# Altium schematic symbol library AD_Lib.SchLib: 1239 symbols (part 4 of 9) (continued)
## IC_R4F70580SCK80FPV (continued)
part C text: Power = PVcc1
part D text: Power = PVcc2

## IC_RTC-7301SF
designator IC?, comment RTC-7301SF
RTC,4bit,2.4~5.5V; Manufacturer: Epson ToYoCom; pro-environment: RoHS; Quality: -40~85¡æ; SN: 03.4.11.14.75730101S; OPN: RTC-7301SF:B3; PadsNum: 0; Value: 2.4~5.5V; Category: ¼¯³ÉÐ¾Æ¬; Part: RTC-7301SF; QTY: 250; Price: 37.7325; OPN_JLC: OPN_JLC; SN_JLC: SN_JLC; Price_JLC: 0
footprint RTC-7301SF (RTC£¬·Ç±ê×¼SSOP-24)
pins: 1 ~{CS0} (in), 2 FCON (in), 3 FOUT (out), 4 VTEMP (in), 5 VDD (power), 6 ~{IRQ} (out), 7 A0 (in), 8 A1 (in), 9 A2 (in), 10 A3 (in), 11 ~{RD} (in), 12 GND (power), 13 ~{WR} (in), 14 D3 (io), 15 D2 (io), 16 D1 (io), 17 D0 (io), 18 CS1 (in), 19 VDD (power), 20 VDD (power), 21 VDD (power), 22 VDD (power), 23 VDD (power), 24 VDD (power)

## IC_SCE5743P
designator IC?, comment SCE5743
µãÕóÊýÂë¹Ü£¬4×Ö·û£¬SPI½Ó¿Ú; Manufacturer: ORSAM; pro-environment: RoHS; Quality: -40~85¡æ; SN: 03.4.33.11.11574310S; Value: Green; other: Vcc=5V; OPN: SCE5743P; PadsNum: 0; Category: ¼¯³ÉÐ¾Æ¬; Part: SCE5743; QTY: 20; Price: ?; OPN_JLC: OPN_JLC; SN_JLC: SN_JLC; Price_JLC: 0
footprint SCE5743P (µãÕóÊýÂë¹Ü)
pins: 1 VCC (power) "Anode", 2 LOAD (in) "Anode", 3 DATA (io) "Anode", 4 NC "Anode", 5 ~{SDCLK} (in) "Anode", 6 ~{RST} (in) "Anode", 7 GND (power) "Anode"

## IC_SI4460-C2A-GM
designator IC?, comment SI4460
RFÊÕ·¢Æ÷; 1Mb/s; 142~1050MHz; 13dBm; 1.8~3.6V;; Manufacturer: Silicon Labs; pro-environment: RoHS; Quality: -40~85¡æ; Value: 1Mb/s, 1.8~3.6V;; OPN: SI4460-C2A-GM; other: Tx&Rx; 1Mb/s; 142~1050MHz; 13dBm; 1.8~3.6V;; PadsNum: 0; SN: SN; Category: ¼¯³ÉÐ¾Æ¬; Part: SI4460; QTY: 490; Price: 17.3628; OPN_JLC: OPN_JLC; SN_JLC: SN_JLC; Price_JLC: 0
footprint QFN20_4*4 (20-Pin Plastic Quad Flat No-Lead 0.65 mm Pitch, IPC Low Density)
pins: 0 PAD (power), 1 SDN (in), 2 RxP (in), 3 RxN (in), 4 Tx (out), 7 TXRAMP (out), 8 VDD (power), 9 GPIO0 (io), 10 GPIO1 (io), 11 ~{IRQ} (out), 12 SCLK (in), 13 SDO (out), 14 SDI (in), 15 ~{SEL} (in), 16 XOUT (out), 17 XIN (in), 18 GND (power), 19 GPIO2 (io), 20 GPIO3 (io)
text: ISM; ÊÕ·¢Æ÷

## IC_SI8751AB-IS
designator IC?, comment SI8751
¹âñî; FETÇý¶¯;; Manufacturer: Silicon Labs; pro-environment: RoHS; Quality: -40~105¡æ; Value: 7.9kHz; OPN: SI8751AB-ISR; other: 2.25V~5.5V; PadsNum: 8; SN: SN; Category: ¼¯³ÉÐ¾Æ¬; Part: SI8751; QTY: 96; Price: 9.7971; OPN_JLC: SI8751AB-ISR; SN_JLC: C430294; Price_JLC: 0
footprint SO-8 (SOIC, 8-Leads, Body 4.9x3.9mm, Pitch 1.27mm, IPC Low Density)
pins: 1 VDD (power), 2 TT (in), 3 IN (in), 4 GND (power), 5 SOURCE (out), 6 MCAP2 (power), 7 MCAP1, 8 GATE (out)
text: CAP1; D; S; CAP2

## IC_Si8902B-A01-GS
designator IC?, comment SI8902B
AD; ¸ôÀëÐÍ; 3Í¨µÀ; 10bit; SPI; 2.7~3.6V; Manufacturer: Silicon Labs; Quality: -40~85¡æ; Value: 200 kS/s,10bit; pro-environment: RoHS; other: 200 kS/s;10bit;2.7V~3.6V; 2.5kV; OPN: Si8902B-A01-GS; PadsNum: 16; SN: SN; Category: ¼¯³ÉÐ¾Æ¬; Part: SI8902B; QTY: 50; Price: 23.3797; OPN_JLC: OPN_JLC; SN_JLC: SN_JLC; Price_JLC: -
footprint SO-16_W (¿íÌåSO-16£¬ÈçADuM1410BRWZ)
pins: 1 VDDA (power), 2 ~{RST} (in), 4 VREF (in), 5 AIN0 (in), 6 AIN1 (in), 7 AIN2 (in), 8 GNDA (power), 9 GNDB (power), 10 VDDB (power), 11 ~{CS} (in), 12 SDI (in), 13 SCLK (in), 14 SDO (out), 16 VDDB (power)
text: AD; ×ª»»Æ÷; 10bit, SPI; ¸ôÀëÐÍ

## IC_Si8932B-IS
designator IC?, comment Si8932
¸ôÀëÔË·Å; Vin=0~2.5V; BW=600kHz; 3.0~5.5V; Manufacturer: Silicon Labs; pro-environment: RoHS; Quality: -40~125¡æ; OPN: Si8932B-IS; other: 3V~5.5V;Gain=1 V/V; PadsNum: 8; SN: SN; Value: BW=600kHz; Category: ¼¯³ÉÐ¾Æ¬; Part: Si8932; QTY: 84; Price: 32.3406; OPN_JLC: Si8932B-IS; SN_JLC: SN_JLC; Price_JLC: -
footprint SSO-8 (¸ôÀëÔË·Å£¬ADI)
pins: 1 VDDA (power), 2 Vin (in), 4 GNDA (power), 5 GNDB (power), 6 GNDB (power), 7 AO (out), 8 VDDB
text: 5,6

## IC_SI-60118-F
designator IC?, comment SI-60118-F
ÒÔÌ«Íø¶Ë×Ó; Manufacturer: Bel; pro-environment: RoHS; Quality: -40~85¡æ; SN: 03.4.31.26.99601801S; Value: 10kHz~100MHz; other: 1.5kV,10kHz~100MHz; PadsNum: 0; Category: ¼¯³ÉÐ¾Æ¬; OPN: SI-60118-F; Part: SI-60118-F; QTY: 50; Price: 31.5315; OPN_JLC: OPN_JLC; SN_JLC: SN_JLC; Price_JLC: 0
footprint SI-60118-F
pins: 1 TD+, 2 CT, 3 TD-, 4 RD+, 5 CT, 6 RD-, 8 CHS, 9 LED_LA-G, 10 LED_LK-G, 11 LED_RA-Y, 12 LED_RK-Y, 15 CHS, 16 CHS

## IC_SN65HVD11D
designator IC?, comment SN65HVD11D
RS485ÊÕ·¢Æ÷,°ëË«¹¤,3.0~3.6V; Manufacturer: TI; Quality: -40~85¡æ; Value: RS485,10Mb/s; pro-environment: RoHS; SN: 03.4.11.25.82651101S; PadsNum: 0; other: 3.0~3.6V; Category: ¼¯³ÉÐ¾Æ¬; OPN: SN65HVD11D; Part: SN65HVD11D; QTY: 75; Price: 21.411; OPN_JLC: OPN_JLC; SN_JLC: SN_JLC; Price_JLC: 0
footprint SO-8 (SOIC, 8-Leads, Body 4.9x3.9mm, Pitch 1.27mm, IPC Low Density)
pins: 1 R (out), 2 ~{RE} (in), 3 DE (in), 4 D (in), 5 GND (power), 6 A (io), 7 B (io), 8 VCC (power)

## IC_SN65HVD33D
designator IC?, comment SN65HVD33
RS485ÊÕ·¢Æ÷,È«Ë«¹¤,3~3.6V; Manufacturer: TI; Quality: -40~85¡æ; Value: 26 Mb/s; pro-environment: RoHS; other: 3~3.6V,26 Mb/s,È«Ë«¹¤; OPN: SN65HVD33D; PadsNum: 0; SN: SN; Category: ¼¯³ÉÐ¾Æ¬; Part: SN65HVD33; QTY: 50; Price: 25.2252; OPN_JLC: OPN_JLC; SN_JLC: SN_JLC; Price_JLC: 0
footprint SO-14 (14-Pin Small Outline Integrated Circuit 1.27 mm Pitch, IPC Low Density)
pins: 2 RXD (out), 3 ~{RE} (in), 4 DE (in), 5 TXD (in), 6 GND (power), 7 GND (power), 9 Y (io), 10 Z (io), 11 B (io), 12 A (io), 13 VCC (power), 14 VCC (power)

## IC_SN65HVD230D
designator IC?, comment SN65HVD230
CANÊÕ·¢Æ÷,3.0~3.6V; Manufacturer: TI; Quality: -40~85¡æ; Value: CAN,1MBd; pro-environment: RoHS; SN: 03.4.11.25.84D23001S; OPN: SN65HVD230D; PadsNum: 0; other: 3.0~3.6V; Category: ¼¯³ÉÐ¾Æ¬; Part: SN65HVD230; QTY: 75; Price: 17.3043; OPN_JLC: OPN_JLC; SN_JLC: SN_JLC; Price_JLC: 0
footprint SO-8 (SOIC, 8-Leads, Body 4.9x3.9mm, Pitch 1.27mm, IPC Low Density)
pins: 1 TXD (in), 2 GND (power), 3 VCC (power), 4 RXD (out), 5 Vref (power), 6 CANL (io), 7 CANH (io), 8 Rs (in)

## IC_SN65HVD1050D
designator IC?, comment SN65HVD1050
CANÊÕ·¢Æ÷,4.5~5.5V; Manufacturer: TI; Quality: -40~125¡æ; Value: CAN,1MBd; pro-environment: RoHS; SN: 03.4.11.25.84105002S; OPN: SN65HVD1050D; PadsNum: 0; other: 4.5~5.5V; Category: ¼¯³ÉÐ¾Æ¬; Part: SN65HVD1050; QTY: 75; Price: 8.0379; OPN_JLC: OPN_JLC; SN_JLC: SN_JLC; Price_JLC: 0
footprint SO-8 (SOIC, 8-Leads, Body 4.9x3.9mm, Pitch 1.27mm, IPC Low Density)
pins: 1 TXD (in), 2 GND (power), 3 VCC (power), 4 RXD (out), 5 Vref (power), 6 CANL (io), 7 CANH (io), 8 S (in)

## IC_SN65LBC184
designator IC?, comment SN65LBC184
RS485ÊÕ·¢Æ÷,°ëË«¹¤,4.75~5.25V; Manufacturer: TI; Quality: -40~85¡æ; Value: RS485,0.25Mb/s; pro-environment: RoHS; SN: 03.4.11.25.8465LB01S; OPN: SN65LBC184D; PadsNum: 0; other: 4.75~5.25V; Category: ¼¯³ÉÐ¾Æ¬; Part: SN65LBC184; QTY: 75; Price: 22.9554; OPN_JLC: OPN_JLC; SN_JLC: SN_JLC; Price_JLC: 0
footprint SO-8 (SOIC, 8-Leads, Body 4.9x3.9mm, Pitch 1.27mm, IPC Low Density)
pins: 1 R (out), 2 ~{RE} (in), 3 DE (in), 4 D (in), 5 GND (power), 6 A (io), 7 B (io), 8 VCC (power)

## IC_SN74AHC00PW
designator IC?, comment SN74AHC00
Âß¼­ÃÅ_Óë·ÇÃÅ,4P,2~5.5V; Manufacturer: TI; pro-environment: RoHS; Quality: -40~125¡æ; SN: 03.4.11.18.75HC0001S; Other: 4Í¨µÀ2ÊäÈë»òÓë·ÇÃÅ; Value: NAND,2~5.5V; OPN: SN74AHC00PW; PadsNum: 0; Category: ¼¯³ÉÐ¾Æ¬; Part: SN74AHC00; QTY: 90; Price: 1.404; OPN_JLC: OPN_JLC; SN_JLC: SN_JLC; Price_JLC: 0
footprint SOT353_M (SOT353, 5-Leads, Body 2x1.3mm, Pitch 0.65mm, Lead Span 2.1mm, IPC Low Density)
footprint TSSOP-14 (TSOP, 14-Leads, Body 5x4.4mm, Pitch 0.65mm, IPC Low Density)
part A pins: 1 A (in), 2 B (in), 3 Y (out)
part B pins: 4 A (in), 5 B (in), 6 Y (out)
part C pins: 8 Y (out), 9 A (in), 10 B (in)
part D pins: 11 Y (out), 12 A (in), 13 B (in)
part E pins: 7 GND (power), 14 VCC (power)
part A text: NAND
part B text: NAND
part C text: NAND
part D text: NAND

## IC_SN74AHC1G14DBVT
designator IC?, comment SN74AHC1G14
µ¥·´ÏàÆ÷; Manufacturer: Texas Instruments; pro-environment: RoHS; Quality: -40~80¡æ; SN: 03.4.11.18.491G1401S; OPN: SN74AHC1G14DBVT; Value: 2~5.5V; PadsNum: 0; part: SN74AHC1G14; QTY: 3000; Price: ?; OPN_JLC: OPN_JLC; SN_JLC: SN_JLC; Price_JLC: 0
footprint SOT23-5 (SOT23, 5-Leads, Body 2.9x1.6mm, Pitch 0.95mm, Lead Span 2.7mm, IPC Low Density)
pins: 2 A (in), 3 GND (power), 4 ~{Y} (out), 5 VDD (power)
text: Vcc; Gnd

## IC_SN74AHC1G32DBVR
designator IC?, comment SN74AHC1G32
Âß¼­ÃÅ_»òÃÅ,1P,1.65~5.5V; Manufacturer: TI; pro-environment: RoHS; Quality: -40~85¡æ; SN: 03.4.11.18.491G3202S; Other: µ¥Í¨µÀ2ÊäÈë»òÃÅ; Value: OR,1.65~5.5V; OPN: SN74AHC1G32DBVR; PadsNum: 0; Category: ¼¯³ÉÐ¾Æ¬; Part: SN74AHC1G32; QTY: 3000; Price: 0.71604; OPN_JLC: OPN_JLC; SN_JLC: SN_JLC; Price_JLC: 0
footprint SOT353_M (SOT353, 5-Leads, Body 2x1.3mm, Pitch 0.65mm, Lead Span 2.1mm, IPC Low Density)
footprint SOT23-5 (SOT23, 5-Leads, Body 2.9x1.6mm, Pitch 0.95mm, Lead Span 2.7mm, IPC Low Density)
pins: 1 A (in), 2 B (in), 3 GND (power), 4 Y (out), 5 VDD (power)
text: Vcc; OR; Gnd

## IC_SN74AHC14PW
designator IC?, comment SN74AHC14  (value not drawn)
Âß¼­ÃÅ_·ÇÃÅ,6P,2.0~5.5V; Manufacturer: TI; pro-environment: RoHS; Quality: -55~150¡æ; SN: 03.4.11.18.75AH1401; Value: NOT,2.0~5.5V; OPN: SN74AHC14PW; PadsNum: 0; Category: ¼¯³ÉÐ¾Æ¬; Part: SN74AHC14; QTY: 90; Price: 1.2987; OPN_JLC: OPN_JLC; SN_JLC: SN_JLC; Price_JLC: 0
footprint TSSOP-14 (Shrink Small Outline; 14 Leads; Body Width 4.4 mm; Pitch 0.65 mm)
part A pins: 1 A (in), 2 ~{Y} (out)
part B pins: 3 A (in), 4 ~{Y} (out)
part C pins: 5 A (in), 6 ~{Y} (out)
part D pins: 8 ~{Y} (out), 9 A (in)
part E pins: 10 ~{Y} (out), 11 A (in)
part F pins: 12 ~{Y} (out), 13 A (in)
part G pins: 7 GND (power), 14 VCC (power)

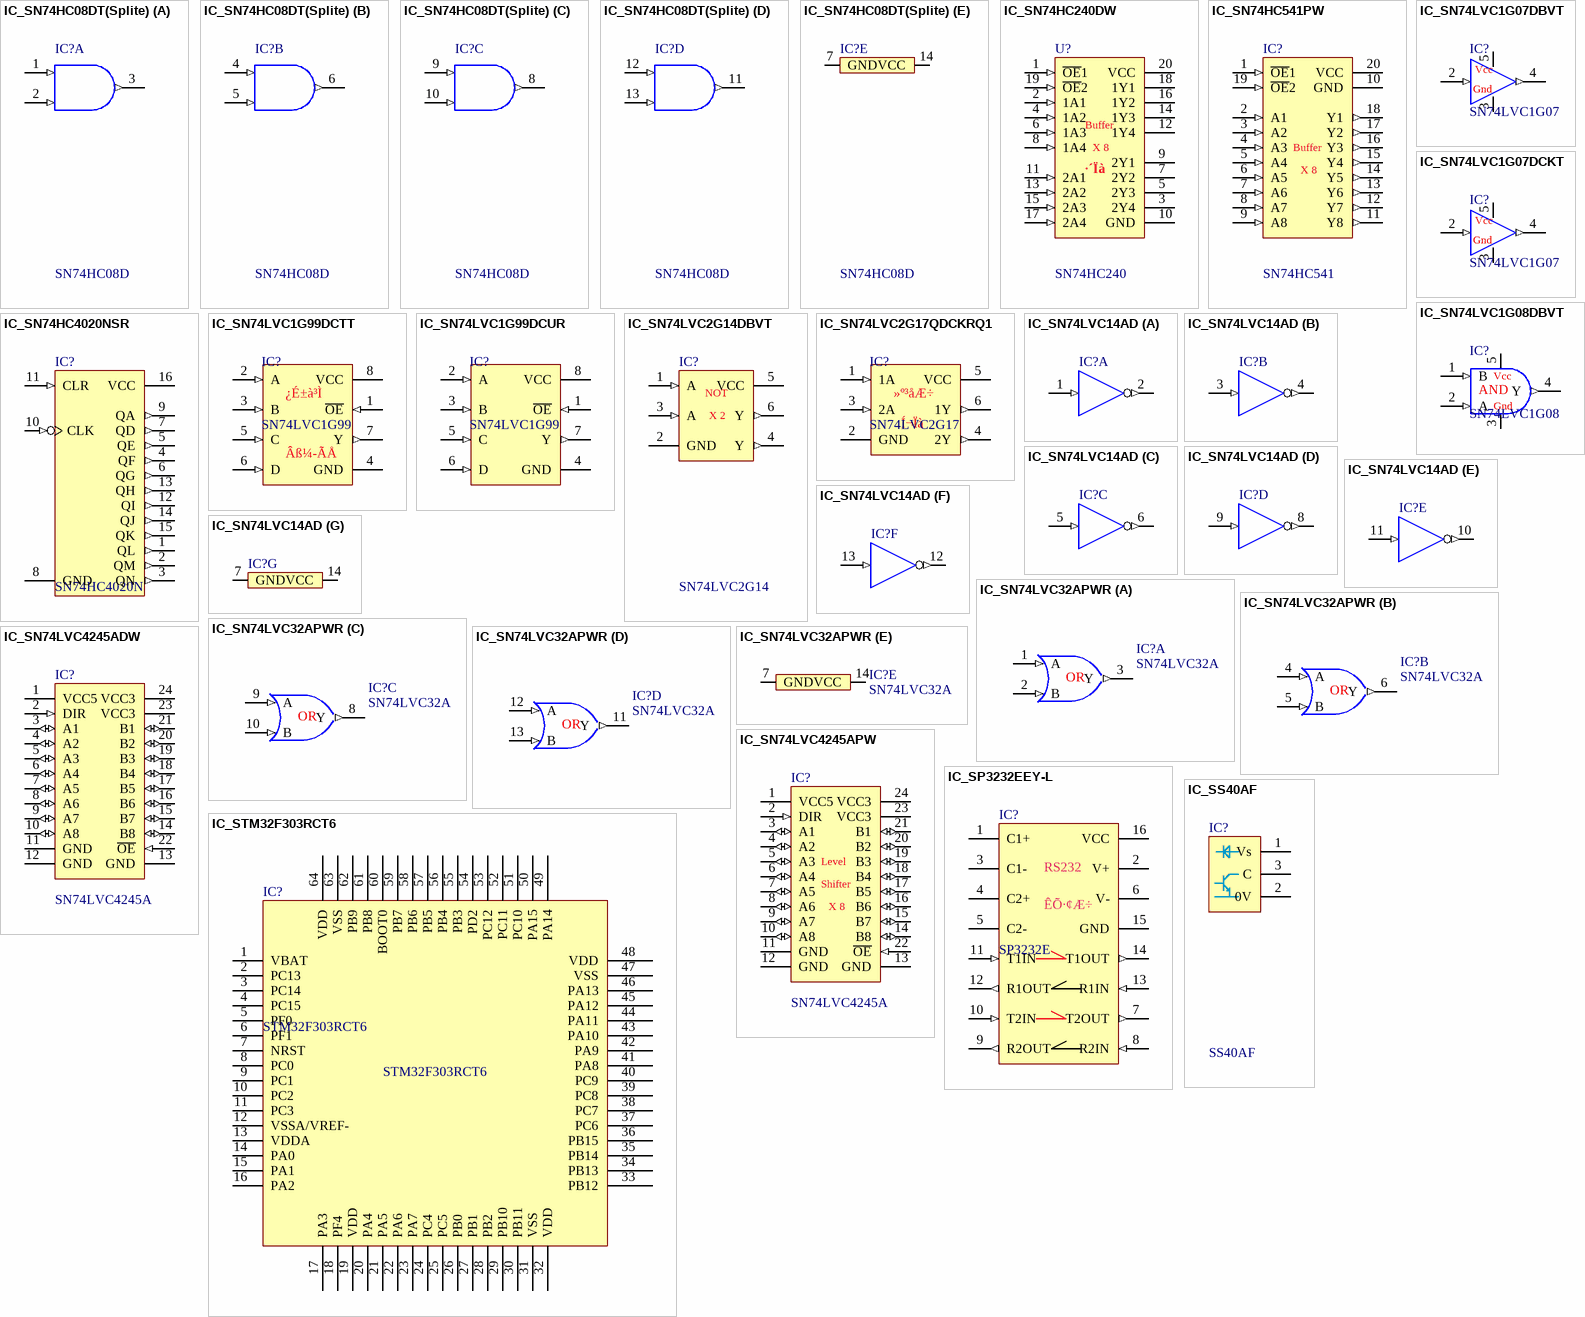
[diagram p18: symbols IC_SN74HC08DT(Splite) to IC_STM32F303RCT6]

## IC_SN74HC08DT(Splite)
designator IC?, comment SN74HC08D
Âß¼­ÃÅ_ÓëÃÅ,4P,2.0~6V; Manufacturer: TI; pro-environment: RoHS; Quality: -40~85¡æ; SN: 03.4.11.18.82HC0801S; OPN: SN74HC08DT; Value: AND,2.0~6V; PadsNum: 0; Category: ¼¯³ÉÐ¾Æ¬; Part: SN74HC08D; QTY: 250; Price: 3.3579; OPN_JLC: OPN_JLC; SN_JLC: SN_JLC; Price_JLC: 0
footprint SO-14 (14-Pin Small Outline Integrated Circuit 1.27 mm Pitch, IPC Low Density)
part A pins: 1 A (in), 2 B (in), 3 Y (out)
part B pins: 4 A (in), 5 B (in), 6 Y (out)
part C pins: 8 Y (out), 9 A (in), 10 B (in)
part D pins: 11 Y (out), 12 A (in), 13 B (in)
part E pins: 7 GND (power), 14 VCC (power)

## IC_SN74HC240DW
designator U?, comment SN74HC240
»º³åÆ÷;8bit;·´Ïà; Manufacturer: TI; pro-environment: RoHS; Quality: -40~85¡æ; Value: Buffer,2~6V; OPN: SN74HC240DW; PadsNum: 0; SN: SN; Category: ¼¯³ÉÐ¾Æ¬; Part: SN74HC240; QTY: 25; Price: 4.0014; OPN_JLC: OPN_JLC; SN_JLC: SN_JLC; Price_JLC: 0
footprint SO-20 (SOIC, 20-Leads, Body 12.8x7.5mm, Pitch 1.27mm, IPC Low Density)
pins: 1 ~{OE}1 (in), 2 1A1 (in), 3 2Y4 (hiz), 4 1A2 (in), 5 2Y3 (hiz), 6 1A3 (in), 7 2Y2 (hiz), 8 1A4 (in), 9 2Y1 (hiz), 10 GND (power), 11 2A1 (in), 12 1Y4 (hiz), 13 2A2 (in), 14 1Y3 (hiz), 15 2A3 (in), 16 1Y2 (hiz), 17 2A4 (in), 18 1Y1 (hiz), 19 ~{OE}2 (in), 20 VCC (power)
text: Buffer; X 8; ·´Ïà

## IC_SN74HC541PW
designator IC?, comment SN74HC541
»º³åÆ÷;8bit; Manufacturer: TI; pro-environment: RoHS; Quality: -40~85¡æ; SN: 03.4.11.19.75H54101S; Value: Buffer; other: Vcc=2~6V; OPN: SN74HC541PW; PadsNum: 0; Category: ¼¯³ÉÐ¾Æ¬; Part: SN74HC541; Price: ?; OPN_JLC: OPN_JLC; SN_JLC: SN_JLC; Price_JLC: 0
footprint TSSOP-20 (Shrink Small Outline; 20 Leads; Body Width 4.4 mm; Pitch 0.65 mm)
pins: 1 ~{OE}1 (in), 2 A1 (in), 3 A2 (in), 4 A3 (in), 5 A4 (in), 6 A5 (in), 7 A6 (in), 8 A7 (in), 9 A8 (in), 10 GND (power), 11 Y8 (out), 12 Y7 (out), 13 Y6 (out), 14 Y5 (out), 15 Y4 (out), 16 Y3 (out), 17 Y2 (out), 18 Y1 (out), 19 ~{OE}2 (in), 20 VCC (power)
text: X 8

## IC_SN74HC4020NSR
designator IC?, comment SN74HC4020N
¼ÆÊýÆ÷;14bit;3.3/5V; Manufacturer: TI; pro-environment: RoHS; Quality: -40~85¡æ; Value: 14bit,2~6V; OPN: SN74HC4020NSR; PadsNum: 0; SN: SN; Category: ¼¯³ÉÐ¾Æ¬; Part: SN74HC4020N; QTY: 2000; Price: 1.7433; OPN_JLC: OPN_JLC; SN_JLC: SN_JLC; Price_JLC: 0
footprint SO-16 (16-Pin Small Outline Package 1.27 mm Pitch, IPC Low Density)
pins: 1 QL (out), 2 QM (out), 3 QN (out), 4 QF (out), 5 QE (out), 6 QG (out), 7 QD (out), 8 GND (power), 9 QA (out), 10 CLK (in), 11 CLR (in), 12 QI (out), 13 QH (out), 14 QJ (out), 15 QK (out), 16 VCC (power)

## IC_SN74LVC1G07DBVT
designator IC?, comment SN74LVC1G07
µ¥»º³åÆ÷;3.3V/5V; Manufacturer: Texas Instruments; pro-environment: RoHS; Quality: -40~125¡æ; OPN: SN74LVC1G07DBVT; Value: 1.65~5.5V; PadsNum: 0; SN: SN; part: SN74LVC1G07; QTY: 250; Price: 3.3345; OPN_JLC: OPN_JLC; SN_JLC: SN_JLC; Price_JLC: 0
footprint SOT23-5 (SOT23, 5-Leads, Body 2.9x1.6mm, Pitch 0.95mm, Lead Span 2.7mm, IPC Low Density)
pins: 2 A (in), 3 GND (power), 4 ~{Y} (out), 5 VDD (power)
text: Vcc; Gnd

## IC_SN74LVC1G07DCKT
designator IC?, comment SN74LVC1G07
µ¥»º³åÆ÷;3.3V/5V; Manufacturer: Texas Instruments; pro-environment: RoHS; Quality: -40~80¡æ; SN: 03.4.11.18.381G0701S; OPN: SN74LVC1G07DCKT; Value: 1.65~5.5V; PadsNum: 0; part: SN74LVC1G07; QTY: 250; Price: 3.3345; OPN_JLC: OPN_JLC; SN_JLC: SN_JLC; Price_JLC: 0
footprint SOT353-5 (SC-70, 5-Leads, Body 2x1.3mm, Pitch 0.65mm, Lead Span 2.1mm, IPC Low Density)
pins: 2 A (in), 3 GND (power), 4 ~{Y} (out), 5 VDD (power)
text: Vcc; Gnd

## IC_SN74LVC1G08DBVT
designator IC?, comment SN74LVC1G08
Âß¼­ÃÅ_ÓëÃÅ,1P,1.65~5.5V; Manufacturer: TI; pro-environment: RoHS; Quality: -40~85¡æ; SN: 03.4.11.18.491G0801S; Other: µ¥Í¨µÀ2ÊäÈëÓëÃÅ; Value: AND,1.65~5.5V; OPN: SN74LVC1G08DBVT; PadsNum: 0; Category: ¼¯³ÉÐ¾Æ¬; Part: SN74LVC1G08; Price: ?; OPN_JLC: OPN_JLC; SN_JLC: SN_JLC; Price_JLC: 0
footprint SOT353_M (SOT353, 5-Leads, Body 2x1.3mm, Pitch 0.65mm, Lead Span 2.1mm, IPC Low Density)
footprint SOT23-5 (SOT23, 5-Leads, Body 2.9x1.6mm, Pitch 0.95mm, Lead Span 2.7mm, IPC Low Density)
pins: 1 B (in), 2 A (in), 3 GND (power), 4 Y (out), 5 VDD (power)
text: Vcc; AND; Gnd

## IC_SN74LVC1G99DCTT
designator IC?, comment SN74LVC1G99
¿É±à³ÌÂß¼­ÃÅ;2In;Ê©ÃÜÌØÊäÈë; Manufacturer: TI; pro-environment: RoHS; Quality: -40~125¡æ; OPN: SN74LVC1G99DCTT; Value: 1.8~5V; PadsNum: 0; SN: SN; part: SN74LVC1G99; QTY: 3000; Price: 1.3447; Category: ¼¯³ÉÐ¾Æ¬; OPN_JLC: OPN_JLC; SN_JLC: SN_JLC; Price_JLC: 0
footprint MSOP-8 (Shrink Small Outline; 8 Leads; Body Width 3 mm; Pitch 0.65 mm)
pins: 1 ~{OE} (in), 2 A (in), 3 B (in), 4 GND (power), 5 C (in), 6 D (in), 7 Y (out), 8 VCC
text: ¿É±à³Ì; Âß¼­ÃÅ

## IC_SN74LVC1G99DCUR
designator IC?, comment SN74LVC1G99
¿É±à³ÌÂß¼­ÃÅ;2In;Ê©ÃÜÌØÊäÈë; Manufacturer: TI; pro-environment: RoHS; Quality: -40~125¡æ; OPN: SN74LVC1G99DCUR; Value: 1.8~5V; PadsNum: 0; SN: SN; part: SN74LVC1G99; QTY: 3000; Price: 1.3447; Category: ¼¯³ÉÐ¾Æ¬; OPN_JLC: OPN_JLC; SN_JLC: SN_JLC; Price_JLC: 0
footprint VSSOP-8 (Footprint not found)
pins: 1 ~{OE} (in), 2 A (in), 3 B (in), 4 GND (power), 5 C (in), 6 D (in), 7 Y (out), 8 VCC

## IC_SN74LVC2G14DBVT
designator IC?, comment SN74LVC2G14
Âß¼­ÃÅ_·ÇÃÅ;2P;1.65~5.5V; Manufacturer: TI; pro-environment: RoHS; Quality: -40~125¡æ; SN: 03.4.11.18.502G1401S; Value: NOT,1.65~5.5V; OPN: SN74LVC2G14DBVT; PadsNum: 0; Category: ¼¯³ÉÐ¾Æ¬; Part: SN74LVC2G14; QTY: 250; Price: 4.8438; OPN_JLC: OPN_JLC; SN_JLC: SN_JLC; Price_JLC: 0
footprint SOT23-6 (SOT23, 6-Leads, Body 2.9x1.6mm, Pitch 0.95mm, Lead Span 2.7mm, IPC Low Density)
pins: 1 A (in), 2 GND (power), 3 A (in), 4 Y (out), 5 VCC (power), 6 Y (out)
text: NOT; X 2

## IC_SN74LVC2G17QDCKRQ1
designator IC?, comment SN74LVC2G17
»º³åÆ÷;2bit;Ê©ÃÜÌØÊäÈë; Manufacturer: Texas Instruments; pro-environment: RoHS; Quality: -40~80¡æ; SN: 03.4.11.19.382G1701S; OPN: SN74LVC2G17QDCKRQ1; Value: 2~5.5V; PadsNum: 0; part: SN74LVC2G17; QTY: 3000; Price: 1.5444; Category: ¼¯³ÉÐ¾Æ¬; OPN_JLC: OPN_JLC; SN_JLC: SN_JLC; Price_JLC: 0
footprint SOT363-6 (SC70-LT6, 6-Leads, Body 2x1.3mm, Pitch 0.65mm, Lead Span 2.1mm, IPC Low Density)
pins: 1 1A (in), 2 GND (power), 3 2A (in), 4 2Y (out), 5 VCC, 6 1Y (out)
text: »º³åÆ÷; Í¬Ïà

## IC_SN74LVC14AD
designator IC?, comment SN74LVC14  (value not drawn)
Âß¼­ÃÅ_·ÇÃÅ,6P,2.0~5.5V; Manufacturer: TI; pro-environment: RoHS; Quality: -40~125¡æ; Value: NOT,2.0~3.6V; OPN: SN74LVC14AD; PadsNum: 0; SN: SN; Category: ¼¯³ÉÐ¾Æ¬; Part: SN74LVC14; QTY: 50; Price: 3.1005; OPN_JLC: OPN_JLC; SN_JLC: SN_JLC; Price_JLC: 0
footprint SO-14 (SOIC, 14-Leads, Body 8.7x3.9mm, Pitch 1.27mm, IPC Low Density)
part A pins: 1 A (in), 2 ~{Y} (out)
part B pins: 3 A (in), 4 ~{Y} (out)
part C pins: 5 A (in), 6 ~{Y} (out)
part D pins: 8 ~{Y} (out), 9 A (in)
part E pins: 10 ~{Y} (out), 11 A (in)
part F pins: 12 ~{Y} (out), 13 A (in)
part G pins: 7 GND (power), 14 VCC (power)

## IC_SN74LVC32APWR
designator IC?, comment SN74LVC32A
Âß¼­ÃÅ_»òÃÅ,4P,1.65~3.6V; Manufacturer: TI; pro-environment: RoHS; Quality: -40~85¡æ; Other: 4Í¨µÀ2ÊäÈë»òÃÅ; Value: OR,1.65~3.6V; OPN: SN74LVC32APWR; PadsNum: 14; SN: SN; Category: ¼¯³ÉÐ¾Æ¬; Part: SN74LVC32A; QTY: 2000; Price: ?; OPN_JLC: SN74LVC32APWR; SN_JLC: C352974; Price_JLC: 0.7637
footprint SOT353_M (SOT353, 5-Leads, Body 2x1.3mm, Pitch 0.65mm, Lead Span 2.1mm, IPC Low Density)
footprint TSSOP-14 (TSOP, 14-Leads, Body 5x4.4mm, Pitch 0.65mm, IPC Low Density)
part A pins: 1 A (in), 2 B (in), 3 Y (out)
part B pins: 4 A (in), 5 B (in), 6 Y (out)
part C pins: 8 Y (out), 9 A (in), 10 B (in)
part D pins: 11 Y (out), 12 A (in), 13 B (in)
part E pins: 7 GND (power), 14 VCC (power)
part A text: OR
part B text: OR
part C text: OR
part D text: OR

## IC_SN74LVC4245ADW
designator IC?, comment SN74LVC4245A
µçÆ½×ª»»£¬8CH; Manufacturer: TI; pro-environment: RoHS; Quality: -40~85¡æ; SN: 03.4.11.18.75424503S; Value: Level shifter,3.3V-5V; other: 3.3V,5.5V; OPN: SN74LVC4245ADW; PadsNum: 0; Category: ¼¯³ÉÐ¾Æ¬; Part: SN74LVC4245A; QTY: 25; Price: ?; OPN_JLC: OPN_JLC; SN_JLC: SN_JLC; Price_JLC: 0
footprint SO-24 (SOIC, 24-Leads, Body 15.4x7.5mm, Pitch 1.27mm,)
pins: 1 VCC5 (power), 2 DIR (in), 3 A1 (io), 4 A2 (io), 5 A3 (io), 6 A4 (io), 7 A5 (io), 8 A6 (io), 9 A7 (io), 10 A8 (io), 11 GND (power), 12 GND (power), 13 GND (power), 14 B8 (io), 15 B7 (io), 16 B6 (io), 17 B5 (io), 18 B4 (io), 19 B3 (io), 20 B2 (io), 21 B1 (io), 22 ~{OE} (in), 23 VCC3 (power), 24 VCC3 (power)

## IC_SN74LVC4245APW
designator IC?, comment SN74LVC4245A
µçÆ½×ª»»£¬8CH; Manufacturer: TI; pro-environment: RoHS; Quality: -40~85¡æ; SN: 03.4.11.19.75424501S; Value: Level shifter,3.3V-5V; other: 3.3V,5.5V; OPN: SN74LVC4245APW; PadsNum: 0; Category: ¼¯³ÉÐ¾Æ¬; Part: SN74LVC4245A; QTY: 60; Price: ?; OPN_JLC: OPN_JLC; SN_JLC: SN_JLC; Price_JLC: 0
footprint TSSOP-24 (Shrink Small Outline; 24 Leads; Body Width 4.4 mm; Pitch 0.65 mm)
pins: 1 VCC5 (power), 2 DIR (in), 3 A1 (io), 4 A2 (io), 5 A3 (io), 6 A4 (io), 7 A5 (io), 8 A6 (io), 9 A7 (io), 10 A8 (io), 11 GND (power), 12 GND (power), 13 GND (power), 14 B8 (io), 15 B7 (io), 16 B6 (io), 17 B5 (io), 18 B4 (io), 19 B3 (io), 20 B2 (io), 21 B1 (io), 22 ~{OE} (in), 23 VCC3 (power), 24 VCC3 (power)
text: Level; Shifter; X 8

## IC_SP3232EEY-L
designator IC?, comment SP3232E
RS232ÊÕ·¢Æ÷£¬2CH; Manufacturer: Exar; Quality: -40~85¡æ; Value: 250kbit/s,3~5.5V; pro-environment: RoHS; SN: 03.4.11.25.75323201S; OPN: SP3232EEY-L; PadsNum: 0; Category: ¼¯³ÉÐ¾Æ¬; Part: SP3232E; QTY: 49; Price: 9.0909; OPN_JLC: OPN_JLC; SN_JLC: SN_JLC; Price_JLC: 0
footprint TSSOP-16 (TSOP, 16-Leads, Body 5x4.4mm, Pitch 0.65mm, IPC Low Density)
pins: 1 C1+, 2 V+, 3 C1-, 4 C2+, 5 C2-, 6 V-, 7 T2OUT (out), 8 R2IN (in), 9 R2OUT (out), 10 T2IN (in), 11 T1IN (in), 12 R1OUT (out), 13 R1IN (in), 14 T1OUT (out), 15 GND (power), 16 VCC (power)
text: RS232; ÊÕ·¢Æ÷

## IC_SS40AF
designator IC?, comment SS40AF
´«¸ÐÆ÷; 4.5~24V; NPN; Î»ÖÃ; Manufacturer: Honeywell; pro-environment: RoHS; Quality: -40~85¡æ; Value: 4.5~24V, NPN; PadsNum: 3; SN: SN; Category: ¼¯³ÉÐ¾Æ¬; OPN: SS40AF; Part: SS40AF; QTY: 3000; other: 4.5~24V; Price: ?; OPN_JLC: SS40AF; SN_JLC: C778657; Price_JLC: 1.0295
footprint U_SS40A (Ö±½Å;TO, Flat Index; 3 In-Line, Axial Leads; Body Dia. 4.7mm; Leads 0.56 x 0.51 mm (max))
pins: 1 Vs (power), 2 0V (power), 3 C (oc)

## IC_STM32F303RCT6
designator IC?, comment STM32F303RCT6
MCU; 32bit; 72MHz; 256kB Flash; 48kB SRAM; Manufacturer: ST; Value: 32bit;72MHz;1.7V~3.6V; pro-environment: RoHS; PadsNum: 0; SN: SN; Category: Microcontrollers -MCU; OPN: STM32F303RCT6; OPN_JLC: STM32F303RCT6; Part: STM32F303RCT6
footprint LQFP-64 (Thin QFP, 64-Leads, Body 10x10mm, Pitch 0.5mm, IPC Low Density)
pins: 1 VBAT, 2 PC13, 3 PC14, 4 PC15, 5 PF0, 6 PF1, 7 NRST, 8 PC0, 9 PC1, 10 PC2, 11 PC3, 12 VSSA/VREF-, 13 VDDA, 14 PA0, 15 PA1, 16 PA2, 17 PA3, 18 PF4, 19 VDD, 20 PA4, 21 PA5, 22 PA6, 23 PA7, 24 PC4, 25 PC5, 26 PB0, 27 PB1, 28 PB2, 29 PB10, 30 PB11, 31 VSS, 32 VDD, 33 PB12, 34 PB13, 35 PB14, 36 PB15, 37 PC6, 38 PC7, 39 PC8, 40 PC9, 41 PA8, 42 PA9, 43 PA10, 44 PA11, 45 PA12, 46 PA13, 47 VSS, 48 VDD, 49 PA14, 50 PA15, 51 PC10, 52 PC11, 53 PC12, 54 PD2, 55 PB3, 56 PB4, 57 PB5, 58 PB6, 59 PB7, 60 BOOT0, 61 PB8, 62 PB9, 63 VSS, 64 VDD

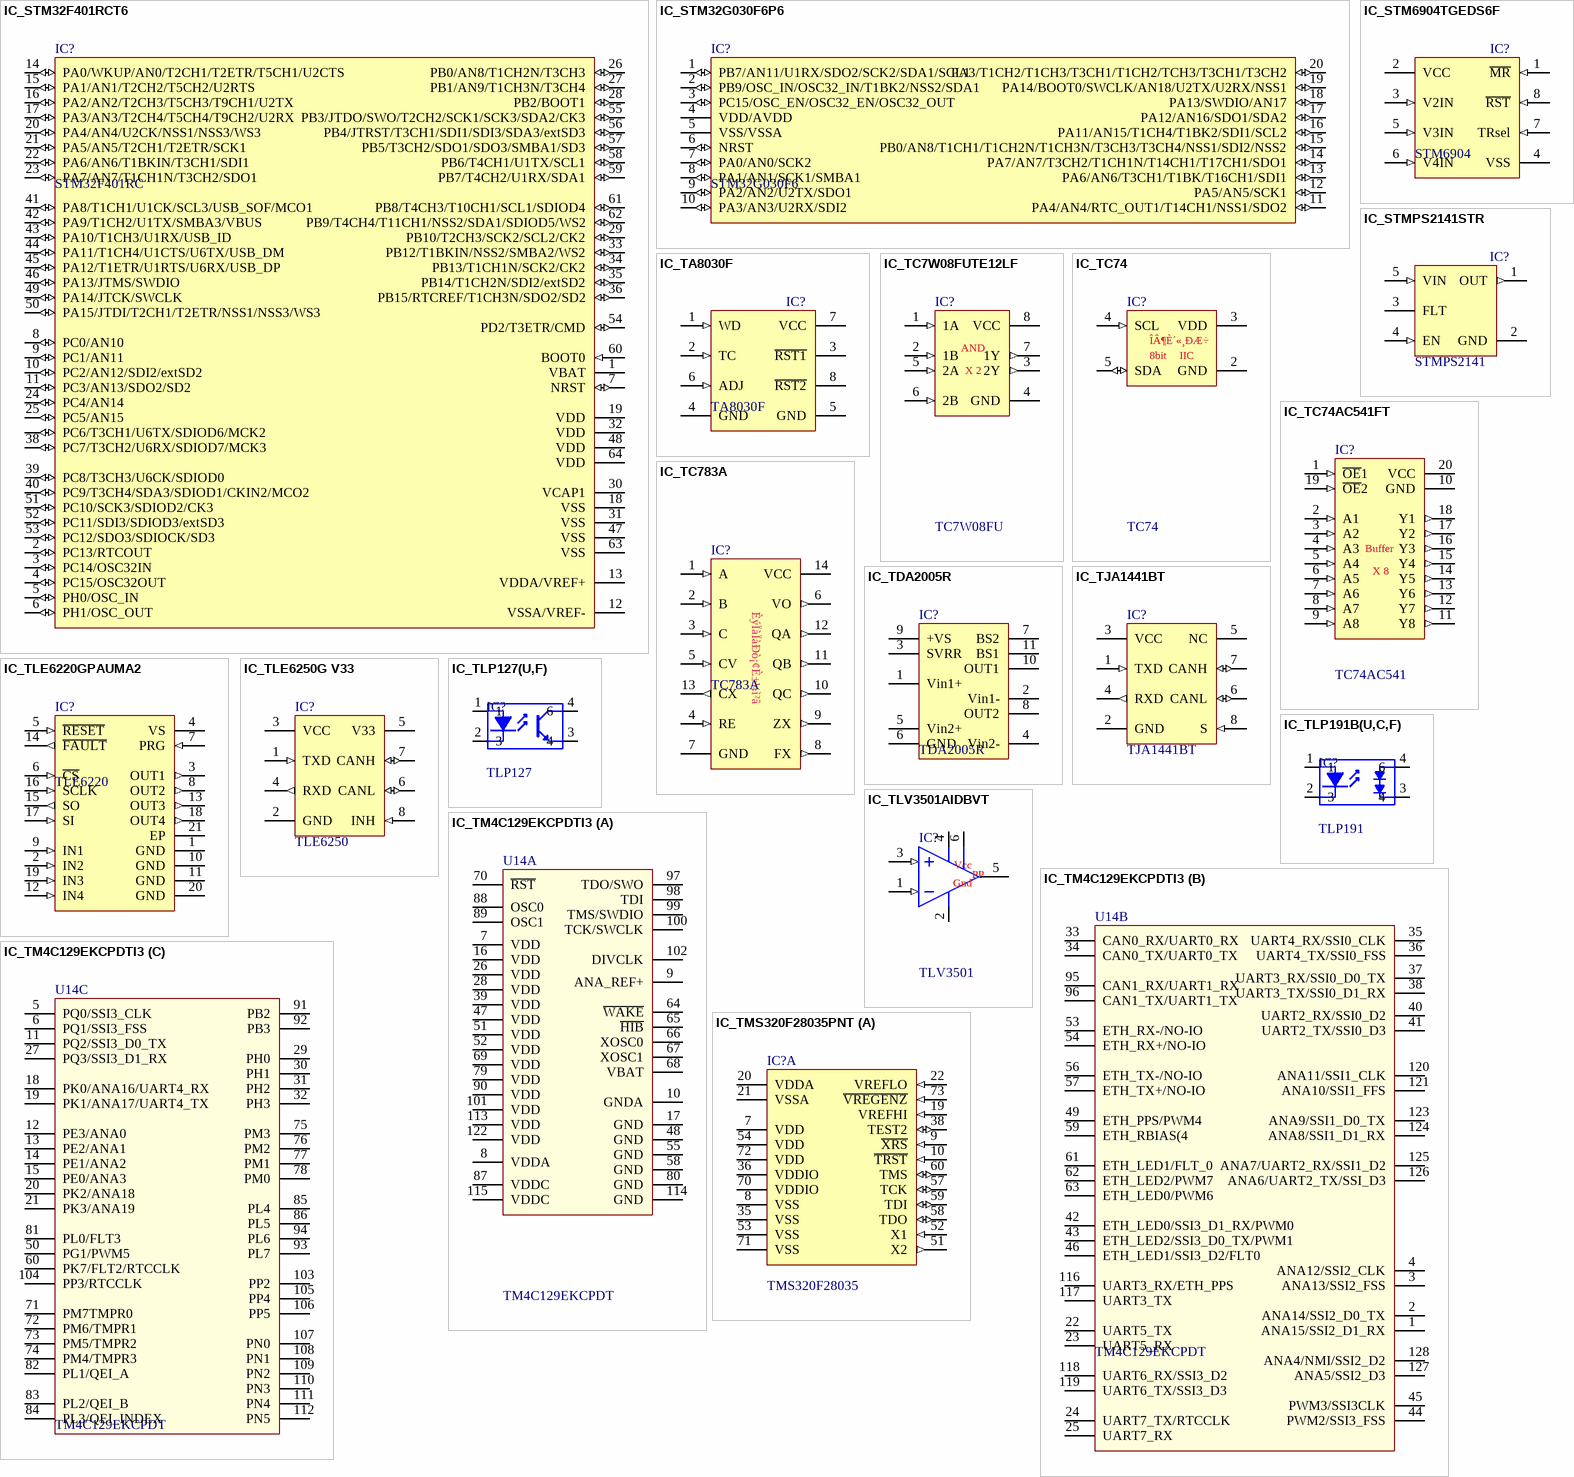
[diagram p19: symbols IC_STM32F401RCT6 to IC_TMS320F28035PNT]

## IC_STM32F401RCT6
designator IC?, comment STM32F401RC
MCU; 32bit; 84MHz; 256kB; 64kB; Manufacturer: ST; Quality: -40~85¡æ; Value: 32bit;84MHz;1.7V~3.6V; pro-environment: RoHS; OPN: STM32F401RCT6; PadsNum: 0; SN: SN; Category: ¼¯³ÉÐ¾Æ¬; Part: STM32F401RC; QTY: 960; Price: 26.0126; OPN_JLC: STM32F401RCT6; SN_JLC: C74524; Price_JLC: 13.93
footprint TQFP-64 (Thin QFP, 64-Leads, Body 10x10mm, Pitch 0.5mm, IPC Low Density)
pins: 1 VBAT (power), 2 PC13/RTCOUT (io) "PC13-ANTI_TAMP/TAMP_1", 3 PC14/OSC32IN (io) "PC14-OSC32_IN/OSC32_IN", 4 PC15/OSC32OUT (io) "PC15-OSC32_OUT/OSC32_OUT", 5 PH0/OSC_IN (io) "PH0-OSC_IN/OSC_IN", 6 PH1/OSC_OUT (io) "PH1-OSC_OUT/OSC_OUT", 7 NRST (io), 8 PC0/AN10 (io) "PC0/ADC1_10", 9 PC1/AN11 (io) "PC1/ADC1_11", 10 PC2/AN12/SDI2/extSD2 (io) "PC2/SPI2_MISO,I2S2ext_SD/ADC1_12", 11 PC3/AN13/SDO2/SD2 (io) "PC3/SPI2_MOSI/I2S2_SD/ADC1_13", 12 VSSA/VREF- (power), 13 VDDA/VREF+ (power), 14 PA0/WKUP/AN0/T2CH1/T2ETR/T5CH1/U2CTS (io) "PA0-WKUP/USART2_CTS,TIM2_CH1/TIM2_ETR,TIM5_CH1/ADC1_0,WKUP", 15 PA1/AN1/T2CH2/T5CH2/U2RTS (io) "PA1/USART2_RTS,TIM2_CH2,TIM5_CH2/ADC1_1", 16 PA2/AN2/T2CH3/T5CH3/T9CH1/U2TX (io) "PA2/USART2_TX,TIM2_CH3,TIM5_CH3,TIM9_CH1/ADC1_2", 17 PA3/AN3/T2CH4/T5CH4/T9CH2/U2RX (io) "PA3/USART2_RX,TIM2_CH4,TIM5_CH4,TIM9_CH2/ADC1_3", 18 VSS (power), 19 VDD (power), 20 PA4/AN4/U2CK/NSS1/NSS3/WS3 (io) "PA4/SPI1_NSS,SPI3_NSS/I2S3_WS,USART2_CK/ADC1_4", 21 PA5/AN5/T2CH1/T2ETR/SCK1 (io) "PA5/SPI1_SCK,TIM2_CH1/TIM2_ETR/ADC1_5", 22 PA6/AN6/T1BKIN/T3CH1/SDI1 (io) "PA6/SPI1_MISO,TIM1_BKIN,TIM3_CH1/ADC1_6", 23 PA7/AN7/T1CH1N/T3CH2/SDO1 (io) "PA7/SPI1_MOSI,TIM1_CH1N,TIM3_CH2/ADC1_7", 24 PC4/AN14 (io) "PC4/ADC1_14", 25 PC5/AN15 (io) "PC5/ADC1_15", 26 PB0/AN8/T1CH2N/T3CH3 (io) "PB0/TIM1_CH2N,TIM3_CH3/ADC1_8", 27 PB1/AN9/T1CH3N/T3CH4 (io) "PB1/TIM1_CH3N,TIM3_CH4/ADC1_9", 28 PB2/BOOT1 (io) "PB2", 29 PB10/T2CH3/SCK2/SCL2/CK2 (io) "PB10/SPI2_SCK/I2S2_CK,I2C2_SCL,TIM2_CH3", 30 VCAP1 (power), 31 VSS (power), 32 VDD (power), 33 PB12/T1BKIN/NSS2/SMBA2/WS2 (io) "PB12/SPI2_NSS/I2S2_WS,I2C2_SMBAL,TIM1_BKIN", 34 PB13/T1CH1N/SCK2/CK2 (io) "PB13/SPI2_SCK/I2S2_CK,TIM1_CH1N", 35 PB14/T1CH2N/SDI2/extSD2 (io) "PB14/SPI2_MISO,I2S2ext_SD,TIM1_CH2N", 36 PB15/RTCREF/T1CH3N/SDO2/SD2 (io) "PB15/SPI2_MOSI/I2S2_SD,TIM1_CH3N,RTC_50Hz", 37 PC6/T3CH1/U6TX/SDIOD6/MCK2 (io) "PC6/I2S2_MCK,USART6_TX,TIM3_CH1,SDIO_D6", 38 PC7/T3CH2/U6RX/SDIOD7/MCK3 (io) "PC7/I2S3_MCK,USART6_RX,TIM3_CH2,SDIO_D7", 39 PC8/T3CH3/U6CK/SDIOD0 (io) "PC8/USART6_CK,TIM3_CH3,SDIO_D0", 40 PC9/T3CH4/SDA3/SDIOD1/CKIN2/MCO2 (io) "PC9/I2S2_CKIN,I2C3_SDA,TIM3_CH4,SDIO_D1,MCO_2", 41 PA8/T1CH1/U1CK/SCL3/USB_SOF/MCO1 (io) "PA8/I2C3_SCL,USART1_CK,TIM1_CH1,USB_FS_SOF,MCO_1", 42 PA9/T1CH2/U1TX/SMBA3/VBUS (io) "PA9/I2C3_SMBAL,USART1_TX,TIM1_CH2,USB_FS_VBUS", 43 PA10/T1CH3/U1RX/USB_ID (io) "PA10/USART1_RX,TIM1_CH3,USB_FS_ID", 44 PA11/T1CH4/U1CTS/U6TX/USB_DM (io) "PA11/USART1_CTS,USART6_TX,TIM1_CH4,USB_FS_DM", 45 PA12/T1ETR/U1RTS/U6RX/USB_DP (io) "PA12/USART1_RTS,USART6_RX,TIM1_ETR,USB_FS_DP", 46 PA13/JTMS/SWDIO (io) "PA13/JTMS-SWDIO", 47 VSS (power), 48 VDD (power), 49 PA14/JTCK/SWCLK (io) "PA14/JTCK-SWCLK", 50 PA15/JTDI/T2CH1/T2ETR/NSS1/NSS3/WS3 (io) "PA15/SPI1_NSS,SPI3_NSS/I2S3_WS,TIM2_CH1/TIM2_ETR,JTDI", 51 PC10/SCK3/SDIOD2/CK3 (io) "PC10/SPI3_SCK/I2S3_CK,SDIO_D2", 52 PC11/SDI3/SDIOD3/extSD3 (io) "PC11/I2S3ext_SD,SPI3_MISO,SDIO_D3", 53 PC12/SDO3/SDIOCK/SD3 (io) "PC12/SPI3_MOSI/I2S3_SD,SDIO_CK", 54 PD2/T3ETR/CMD (io) "PD2/TIM3_ETR,SDIO_CMD", 55 PB3/JTDO/SWO/T2CH2/SCK1/SCK3/SDA2/CK3 (io) "PB3/SPI1_SCK,SPI3_SCK/I2S3_CK,I2C2_SDA,TIM2_CH2,JTDO-SWO", 56 PB4/JTRST/T3CH1/SDI1/SDI3/SDA3/extSD3 (io) "PB4/SPI1_MISO,SPI3_MISO,I2S3ext_SD,I2C3_SDA,TIM3_CH1,JTRST", 57 PB5/T3CH2/SDO1/SDO3/SMBA1/SD3 (io) "PB5/SPI1_MOSI,SPI3_MOSI/I2S3_SD,I2C1_SMBAL,TIM3_CH2", 58 PB6/T4CH1/U1TX/SCL1 (io) "PB6/I2C1_SCL,USART1_TX,TIM4_CH1", 59 PB7/T4CH2/U1RX/SDA1 (io) "PB7/I2C1_SDA,USART1_RX,TIM4_CH2", 60 BOOT0 (in), 61 PB8/T4CH3/T10CH1/SCL1/SDIOD4 (io) "PB8/I2C1_SCL,TIM4_CH3,TIM10_CH1,SDIO_D4", 62 PB9/T4CH4/T11CH1/NSS2/SDA1/SDIOD5/WS2 (io) "PB9/SPI2_NSS/I2S2_WS,I2C1_SDA,TIM4_CH4,TIM11_CH1,SDIO_D5", 63 VSS (power), 64 VDD (power)

## IC_STM32G030F6P6
designator IC?, comment STM32G030F6
MCU; 32bit; 64MHz; 32kB; 8kB; Manufacturer: ST; Quality: -40~85¡æ; Value: 32bit;64MHz;1.7V~3.6V; pro-environment: RoHS; OPN: STM32G030F6P6; PadsNum: 20; SN: SN; Category: ¼¯³ÉÐ¾Æ¬; Part: STM32G030F6; QTY: 960; Price: 9.9553; OPN_JLC: STM32G030F6P6; SN_JLC: C529330; Price_JLC: 4.21
footprint TSSOP-20 (TSOP, 20-Leads, Body 6.5x4.4mm, Pitch 0.65mm, IPC Low Density)
pins: 1 PB7/AN11/U1RX/SDO2/SCK2/SDA1/SCL1 (io), 2 PB9/OSC_IN/OSC32_IN/T1BK2/NSS2/SDA1 (io), 3 PC15/OSC_EN/OSC32_EN/OSC32_OUT (io) "PC15-OSC32_OUT/OSC32_OUT", 4 VDD/AVDD (power) "VDD", 5 VSS/VSSA (power) "VSS", 6 NRST (io), 7 PA0/AN0/SCK2 (io), 8 PA1/AN1/SCK1/SMBA1 (io), 9 PA2/AN2/U2TX/SDO1 (io) "PA2/USART2_TX,TIM2_CH3,TIM5_CH3,TIM9_CH1/ADC1_2", 10 PA3/AN3/U2RX/SDI2 (io) "PA3/USART2_RX,TIM2_CH4,TIM5_CH4,TIM9_CH2/ADC1_3", 11 PA4/AN4/RTC_OUT1/T14CH1/NSS1/SDO2 (io), 12 PA5/AN5/SCK1 (io), 13 PA6/AN6/T3CH1/T1BK/T16CH1/SDI1 (io), 14 PA7/AN7/T3CH2/T1CH1N/T14CH1/T17CH1/SDO1 (io), 15 PB0/AN8/T1CH1/T1CH2N/T1CH3N/T3CH3/T3CH4/NSS1/SDI2/NSS2 (io), 16 PA11/AN15/T1CH4/T1BK2/SDI1/SCL2 (io), 17 PA12/AN16/SDO1/SDA2 (io), 18 PA13/SWDIO/AN17 (io), 19 PA14/BOOT0/SWCLK/AN18/U2TX/U2RX/NSS1 (io), 20 PA3/T1CH2/T1CH3/T3CH1/T1CH2/TCH3/T3CH1/T3CH2 (io)

## IC_STM6904TGEDS6F
designator IC?, comment STM6904
µçÔ´¼àÊÓ; Manufacturer: ST; Value: 3.078 V(1.11 V),4CH,; Quality: -40~85¡æ; pro-environment: RoHS; SN: 03.4.11.11.75690401S; OPN: STM6904TGEDS6F; PadsNum: 0; other: µçÔ´¼àÊÓ; Category: ¼¯³ÉÐ¾Æ¬; Part: STM6904; Price: ?; OPN_JLC: OPN_JLC; SN_JLC: SN_JLC; Price_JLC: 0
footprint MSOP-8 (Shrink Small Outline; 8 Leads; Body Width 3 mm; Pitch 0.65 mm)
pins: 1 ~{MR} (in), 2 VCC (power), 3 V2IN (in), 4 VSS (power), 5 V3IN (in), 6 V4IN (in), 7 TRsel (in), 8 ~{RST} (in)

## IC_STMPS2141STR
designator IC?, comment STMPS2141
Åäµç¿ª¹Ø; 5.5V; 0.5A; Manufacturer: ST; Value: 5.5V, 0.5A; Quality: -40~85¡æ; pro-environment: RoHS; OPN: STMPS2141STR; PadsNum: 5; other: Åäµç¿ª¹Ø; SN: SN; Category: ¼¯³ÉÐ¾Æ¬; Part: STMPS2141; QTY: 3000; Price: 1.4376; OPN_JLC: STMPS2141STR; SN_JLC: C54624; Price_JLC: 3.6386
footprint SOT23-5 (SOT23, 5-Leads, Body 2.9x1.6mm, Pitch 0.95mm, Lead Span 2.7mm, IPC Low Density)
pins: 1 OUT (out), 2 GND (power), 3 FLT (oc), 4 EN (in), 5 VIN (in)

## IC_TA8030F
designator IC?, comment TA8030F
¿´ÃÅ¹·; Manufacturer: ST; Value: 3.078 V(1.11 V),4CH,; Quality: -40~85¡æ; other: µçÔ´¼àÊÓ; pro-environment: RoHS; SN: 03.4.11.11.47803001S; PadsNum: 0; Category: ¼¯³ÉÐ¾Æ¬; OPN: TA8030F; Part: TA8030F; Price: ?; OPN_JLC: OPN_JLC; SN_JLC: SN_JLC; Price_JLC: 0
footprint MSOP-8 (Shrink Small Outline; 8 Leads; Body Width 3 mm; Pitch 0.65 mm)
pins: 1 WD (in), 2 TC (in), 3 ~{RST1} (oc), 4 GND (power), 5 GND (power), 6 ADJ (in), 7 VCC (power), 8 ~{RST2} (oc)

## IC_TC7W08FUTE12LF
designator IC?, comment TC7W08FU
Âß¼­ÃÅ_ÓëÃÅ,2P,2.0~6V; Manufacturer: Toshiba; pro-environment: RoHS; Quality: -40~85¡æ; SN: 03.4.11.18.757W0801S; Value: AND,2.0~6V; OPN: TC7W08FUTE12LF; PadsNum: 0; Category: ¼¯³ÉÐ¾Æ¬; Part: TC7W08FU; QTY: 3000; Price: 1.05066; OPN_JLC: OPN_JLC; SN_JLC: SN_JLC; Price_JLC: 0
footprint TSSOP-8
pins: 1 1A (in), 2 1B (in), 3 2Y (out), 4 GND (power), 5 2A (in), 6 2B (in), 7 1Y (out), 8 VCC (power)
text: AND; X 2